# Altium schematic symbol library jlcpcb_2025_04_resistors_extended_2010.schlib: 1697 symbols (part 6 of 9)
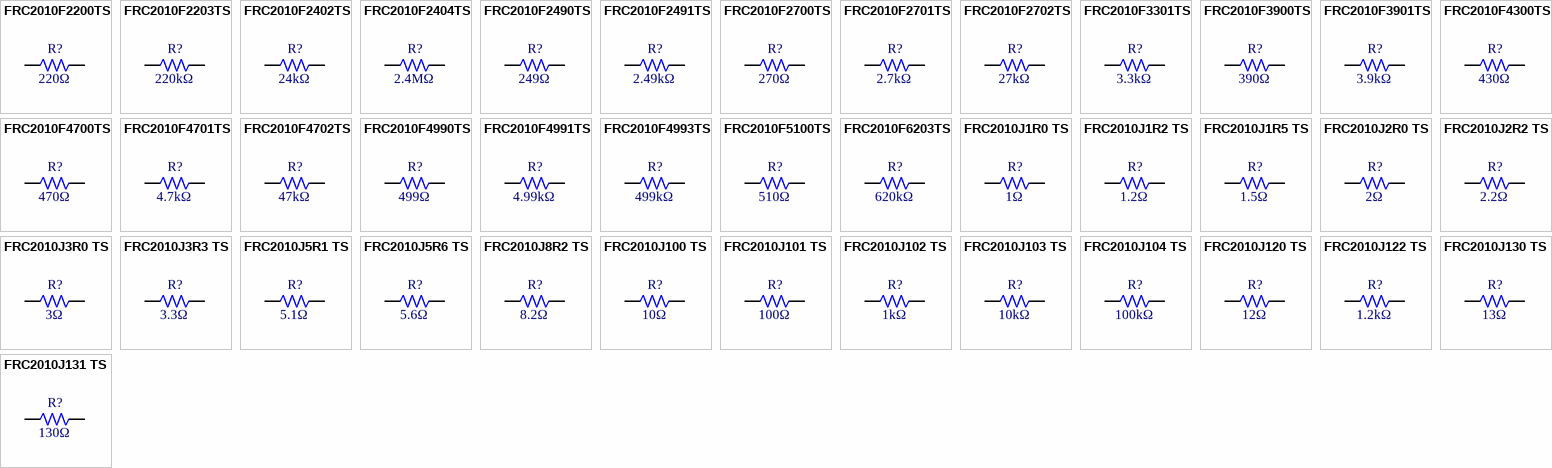
[diagram p47: symbols FRC2010F2200TS to FRC2010J131 TS]

## FRC2010F5100TS
designator R?  Resistance: 510Ω  (hidden comment: *)
Resistor, 510Ω, ±1%, 750mW, 200V, ±100ppm/℃, SMD 2010; Manufacturer: Uniroyal; Manufacturer Part Number: FRC2010F5100TS; Supplier 1: LCSC; Supplier Part Number 1: C3013309; JLCPCB Part Number: C3013309; Power Rating: 750mW; Category: Resistors; Package Size: 2010; JLCPCB Basic Part: Yes; Tolerance: ±1%; Voltage Rating: 200V; Temperature Coefficient: ±100ppm/℃; ComponentLink1Description: Datasheet; ComponentLink1URL: https://wmsc.lcsc.com/wmsc/upload/file/pdf/v2/lcsc/2308241947_FOJAN-FRC2010F5100TS_C3013309.pdf; ComponentLink2Description: JLCPCB Part URL; ComponentLink2URL: https://jlcpcb.com/partdetail/C3013309
pins: 1, 2
1 alternate drawing of the same symbol

## FRC2010F6203TS
designator R?  Resistance: 620kΩ  (hidden comment: *)
Resistor, 620kΩ, ±1%, 750mW, 200V, ±100ppm/℃, -55℃~+155℃, SMD 2010; Manufacturer: Uniroyal; Manufacturer Part Number: FRC2010F6203TS; Supplier 1: LCSC; Supplier Part Number 1: C2930456; JLCPCB Part Number: C2930456; Power Rating: 750mW; Category: Resistors; Package Size: 2010; JLCPCB Basic Part: Yes; Tolerance: ±1%; Voltage Rating: 200V; Temperature Coefficient: ±100ppm/℃; Temperature Rating: -55℃~+155℃; ComponentLink1Description: Datasheet; ComponentLink1URL: https://wmsc.lcsc.com/wmsc/upload/file/pdf/v2/lcsc/2308241947_FOJAN-FRC2010F6203TS_C2930456.pdf; ComponentLink2Description: JLCPCB Part URL; ComponentLink2URL: https://jlcpcb.com/partdetail/C2930456
pins: 1, 2
1 alternate drawing of the same symbol

## FRC2010J1R0 TS
designator R?  Resistance: 1Ω  (hidden comment: *)
Resistor, 1Ω, ±5%, 750mW, 200V, ±200ppm/℃, -55℃~+155℃, SMD 2010; Manufacturer: Uniroyal; Manufacturer Part Number: FRC2010J1R0 TS; Supplier 1: LCSC; Supplier Part Number 1: C2907562; JLCPCB Part Number: C2907562; Power Rating: 750mW; Category: Resistors; Package Size: 2010; JLCPCB Basic Part: Yes; Tolerance: ±5%; Voltage Rating: 200V; Temperature Coefficient: ±200ppm/℃; Temperature Rating: -55℃~+155℃; ComponentLink1Description: Datasheet; ComponentLink1URL: https://wmsc.lcsc.com/wmsc/upload/file/pdf/v2/lcsc/2308241009_FOJAN-FRC2010J1R0-TS_C2907562.pdf; ComponentLink2Description: JLCPCB Part URL; ComponentLink2URL: https://jlcpcb.com/partdetail/C2907562
pins: 1, 2
1 alternate drawing of the same symbol

## FRC2010J1R2 TS
designator R?  Resistance: 1.2Ω  (hidden comment: *)
Resistor, 1.2Ω, ±5%, 750mW, 200V, ±200ppm/℃, -55℃~+155℃, SMD 2010; Manufacturer: Uniroyal; Manufacturer Part Number: FRC2010J1R2 TS; Supplier 1: LCSC; Supplier Part Number 1: C2960840; JLCPCB Part Number: C2960840; Power Rating: 750mW; Category: Resistors; Package Size: 2010; JLCPCB Basic Part: Yes; Tolerance: ±5%; Voltage Rating: 200V; Temperature Coefficient: ±200ppm/℃; Temperature Rating: -55℃~+155℃; ComponentLink1Description: Datasheet; ComponentLink1URL: https://wmsc.lcsc.com/wmsc/upload/file/pdf/v2/lcsc/2308241947_FOJAN-FRC2010J1R2-TS_C2960840.pdf; ComponentLink2Description: JLCPCB Part URL; ComponentLink2URL: https://jlcpcb.com/partdetail/C2960840
pins: 1, 2
1 alternate drawing of the same symbol

## FRC2010J1R5 TS
designator R?  Resistance: 1.5Ω  (hidden comment: *)
Resistor, 1.5Ω, ±5%, 750mW, 200V, ±200ppm/℃, -55℃~+155℃, SMD 2010; Manufacturer: Uniroyal; Manufacturer Part Number: FRC2010J1R5 TS; Supplier 1: LCSC; Supplier Part Number 1: C2934006; JLCPCB Part Number: C2934006; Power Rating: 750mW; Category: Resistors; Package Size: 2010; JLCPCB Basic Part: Yes; Tolerance: ±5%; Voltage Rating: 200V; Temperature Coefficient: ±200ppm/℃; Temperature Rating: -55℃~+155℃; ComponentLink1Description: Datasheet; ComponentLink1URL: https://wmsc.lcsc.com/wmsc/upload/file/pdf/v2/lcsc/2308241947_FOJAN-FRC2010J1R5-TS_C2934006.pdf; ComponentLink2Description: JLCPCB Part URL; ComponentLink2URL: https://jlcpcb.com/partdetail/C2934006
pins: 1, 2
1 alternate drawing of the same symbol

## FRC2010J2R0 TS
designator R?  Resistance: 2Ω  (hidden comment: *)
Resistor, 2Ω, ±5%, 750mW, 200V, ±200ppm/℃, -55℃~+155℃, SMD 2010; Manufacturer: Uniroyal; Manufacturer Part Number: FRC2010J2R0 TS; Supplier 1: LCSC; Supplier Part Number 1: C2960830; JLCPCB Part Number: C2960830; Power Rating: 750mW; Category: Resistors; Package Size: 2010; JLCPCB Basic Part: Yes; Tolerance: ±5%; Voltage Rating: 200V; Temperature Coefficient: ±200ppm/℃; Temperature Rating: -55℃~+155℃; ComponentLink1Description: Datasheet; ComponentLink1URL: https://wmsc.lcsc.com/wmsc/upload/file/pdf/v2/lcsc/2308241947_FOJAN-FRC2010J2R0-TS_C2960830.pdf; ComponentLink2Description: JLCPCB Part URL; ComponentLink2URL: https://jlcpcb.com/partdetail/C2960830
pins: 1, 2
1 alternate drawing of the same symbol

## FRC2010J2R2 TS
designator R?  Resistance: 2.2Ω  (hidden comment: *)
Resistor, 2.2Ω, ±5%, 750mW, 200V, ±200ppm/℃, -55℃~+155℃, SMD 2010; Manufacturer: Uniroyal; Manufacturer Part Number: FRC2010J2R2 TS; Supplier 1: LCSC; Supplier Part Number 1: C2934019; JLCPCB Part Number: C2934019; Power Rating: 750mW; Category: Resistors; Package Size: 2010; JLCPCB Basic Part: Yes; Tolerance: ±5%; Voltage Rating: 200V; Temperature Coefficient: ±200ppm/℃; Temperature Rating: -55℃~+155℃; ComponentLink1Description: Datasheet; ComponentLink1URL: https://wmsc.lcsc.com/wmsc/upload/file/pdf/v2/lcsc/2308241947_FOJAN-FRC2010J2R2-TS_C2934019.pdf; ComponentLink2Description: JLCPCB Part URL; ComponentLink2URL: https://jlcpcb.com/partdetail/C2934019
pins: 1, 2
1 alternate drawing of the same symbol

## FRC2010J3R0 TS
designator R?  Resistance: 3Ω  (hidden comment: *)
Resistor, 3Ω, ±5%, 750mW, 200V, ±200ppm/℃, -55℃~+155℃, SMD 2010; Manufacturer: Uniroyal; Manufacturer Part Number: FRC2010J3R0 TS; Supplier 1: LCSC; Supplier Part Number 1: C2934028; JLCPCB Part Number: C2934028; Power Rating: 750mW; Category: Resistors; Package Size: 2010; JLCPCB Basic Part: Yes; Tolerance: ±5%; Voltage Rating: 200V; Temperature Coefficient: ±200ppm/℃; Temperature Rating: -55℃~+155℃; ComponentLink1Description: Datasheet; ComponentLink1URL: https://wmsc.lcsc.com/wmsc/upload/file/pdf/v2/lcsc/2308241947_FOJAN-FRC2010J3R0-TS_C2934028.pdf; ComponentLink2Description: JLCPCB Part URL; ComponentLink2URL: https://jlcpcb.com/partdetail/C2934028
pins: 1, 2
1 alternate drawing of the same symbol

## FRC2010J3R3 TS
designator R?  Resistance: 3.3Ω  (hidden comment: *)
Resistor, 3.3Ω, ±5%, 750mW, 200V, ±200ppm/℃, -55℃~+155℃, SMD 2010; Manufacturer: Uniroyal; Manufacturer Part Number: FRC2010J3R3 TS; Supplier 1: LCSC; Supplier Part Number 1: C2960892; JLCPCB Part Number: C2960892; Power Rating: 750mW; Category: Resistors; Package Size: 2010; JLCPCB Basic Part: Yes; Tolerance: ±5%; Voltage Rating: 200V; Temperature Coefficient: ±200ppm/℃; Temperature Rating: -55℃~+155℃; ComponentLink1Description: Datasheet; ComponentLink1URL: https://wmsc.lcsc.com/wmsc/upload/file/pdf/v2/lcsc/2308241947_FOJAN-FRC2010J3R3-TS_C2960892.pdf; ComponentLink2Description: JLCPCB Part URL; ComponentLink2URL: https://jlcpcb.com/partdetail/C2960892
pins: 1, 2
1 alternate drawing of the same symbol

## FRC2010J5R1 TS
designator R?  Resistance: 5.1Ω  (hidden comment: *)
Resistor, 5.1Ω, ±5%, 750mW, 200V, ±200ppm/℃, -55℃~+155℃, SMD 2010; Manufacturer: Uniroyal; Manufacturer Part Number: FRC2010J5R1 TS; Supplier 1: LCSC; Supplier Part Number 1: C2934036; JLCPCB Part Number: C2934036; Power Rating: 750mW; Category: Resistors; Package Size: 2010; JLCPCB Basic Part: Yes; Tolerance: ±5%; Voltage Rating: 200V; Temperature Coefficient: ±200ppm/℃; Temperature Rating: -55℃~+155℃; ComponentLink1Description: Datasheet; ComponentLink1URL: https://wmsc.lcsc.com/wmsc/upload/file/pdf/v2/lcsc/2308241947_FOJAN-FRC2010J5R1-TS_C2934036.pdf; ComponentLink2Description: JLCPCB Part URL; ComponentLink2URL: https://jlcpcb.com/partdetail/C2934036
pins: 1, 2
1 alternate drawing of the same symbol

## FRC2010J5R6 TS
designator R?  Resistance: 5.6Ω  (hidden comment: *)
Resistor, 5.6Ω, ±5%, 750mW, 200V, ±200ppm/℃, -55℃~+155℃, SMD 2010; Manufacturer: Uniroyal; Manufacturer Part Number: FRC2010J5R6 TS; Supplier 1: LCSC; Supplier Part Number 1: C2960688; JLCPCB Part Number: C2960688; Power Rating: 750mW; Category: Resistors; Package Size: 2010; JLCPCB Basic Part: Yes; Tolerance: ±5%; Voltage Rating: 200V; Temperature Coefficient: ±200ppm/℃; Temperature Rating: -55℃~+155℃; ComponentLink1Description: Datasheet; ComponentLink1URL: https://wmsc.lcsc.com/wmsc/upload/file/pdf/v2/lcsc/2308241947_FOJAN-FRC2010J5R6-TS_C2960688.pdf; ComponentLink2Description: JLCPCB Part URL; ComponentLink2URL: https://jlcpcb.com/partdetail/C2960688
pins: 1, 2
1 alternate drawing of the same symbol

## FRC2010J8R2 TS
designator R?  Resistance: 8.2Ω  (hidden comment: *)
Resistor, 8.2Ω, ±5%, 750mW, 200V, ±200ppm/℃, SMD 2010; Manufacturer: Uniroyal; Manufacturer Part Number: FRC2010J8R2 TS; Supplier 1: LCSC; Supplier Part Number 1: C3013318; JLCPCB Part Number: C3013318; Power Rating: 750mW; Category: Resistors; Package Size: 2010; JLCPCB Basic Part: Yes; Tolerance: ±5%; Voltage Rating: 200V; Temperature Coefficient: ±200ppm/℃; ComponentLink1Description: Datasheet; ComponentLink1URL: https://wmsc.lcsc.com/wmsc/upload/file/pdf/v2/lcsc/2308241947_FOJAN-FRC2010J8R2-TS_C3013318.pdf; ComponentLink2Description: JLCPCB Part URL; ComponentLink2URL: https://jlcpcb.com/partdetail/C3013318
pins: 1, 2
1 alternate drawing of the same symbol

## FRC2010J100 TS
designator R?  Resistance: 10Ω  (hidden comment: *)
Resistor, 10Ω, ±5%, 750mW, 200V, ±200ppm/℃, -55℃~+155℃, SMD 2010; Manufacturer: Uniroyal; Manufacturer Part Number: FRC2010J100 TS; Supplier 1: LCSC; Supplier Part Number 1: C2974101; JLCPCB Part Number: C2974101; Power Rating: 750mW; Category: Resistors; Package Size: 2010; JLCPCB Basic Part: Yes; Tolerance: ±5%; Voltage Rating: 200V; Temperature Coefficient: ±200ppm/℃; Temperature Rating: -55℃~+155℃; ComponentLink1Description: Datasheet; ComponentLink1URL: https://wmsc.lcsc.com/wmsc/upload/file/pdf/v2/lcsc/2202151130_FOJAN-FRC2010J100-TS_C2974101.pdf; ComponentLink2Description: JLCPCB Part URL; ComponentLink2URL: https://jlcpcb.com/partdetail/C2974101
pins: 1, 2
1 alternate drawing of the same symbol

## FRC2010J101 TS
designator R?  Resistance: 100Ω  (hidden comment: *)
Resistor, 100Ω, ±5%, 750mW, 200V, ±100ppm/℃, -55℃~+155℃, SMD 2010; Manufacturer: Uniroyal; Manufacturer Part Number: FRC2010J101 TS; Supplier 1: LCSC; Supplier Part Number 1: C2907558; JLCPCB Part Number: C2907558; Power Rating: 750mW; Category: Resistors; Package Size: 2010; JLCPCB Basic Part: Yes; Tolerance: ±5%; Voltage Rating: 200V; Temperature Coefficient: ±100ppm/℃; Temperature Rating: -55℃~+155℃; ComponentLink1Description: Datasheet; ComponentLink1URL: https://wmsc.lcsc.com/wmsc/upload/file/pdf/v2/lcsc/2308241947_FOJAN-FRC2010J101-TS_C2907558.pdf; ComponentLink2Description: JLCPCB Part URL; ComponentLink2URL: https://jlcpcb.com/partdetail/C2907558
pins: 1, 2
1 alternate drawing of the same symbol

## FRC2010J102 TS
designator R?  Resistance: 1kΩ  (hidden comment: *)
Resistor, 1kΩ, ±5%, 750mW, 200V, ±100ppm/℃, -55℃~+155℃, SMD 2010; Manufacturer: Uniroyal; Manufacturer Part Number: FRC2010J102 TS; Supplier 1: LCSC; Supplier Part Number 1: C2907561; JLCPCB Part Number: C2907561; Power Rating: 750mW; Category: Resistors; Package Size: 2010; JLCPCB Basic Part: Yes; Tolerance: ±5%; Voltage Rating: 200V; Temperature Coefficient: ±100ppm/℃; Temperature Rating: -55℃~+155℃; ComponentLink1Description: Datasheet; ComponentLink1URL: https://wmsc.lcsc.com/wmsc/upload/file/pdf/v2/lcsc/2308241009_FOJAN-FRC2010J102-TS_C2907561.pdf; ComponentLink2Description: JLCPCB Part URL; ComponentLink2URL: https://jlcpcb.com/partdetail/C2907561
pins: 1, 2
1 alternate drawing of the same symbol

## FRC2010J103 TS
designator R?  Resistance: 10kΩ  (hidden comment: *)
Resistor, 10kΩ, ±5%, 750mW, 200V, ±100ppm/℃, -55℃~+155℃, SMD 2010; Manufacturer: Uniroyal; Manufacturer Part Number: FRC2010J103 TS; Supplier 1: LCSC; Supplier Part Number 1: C2933993; JLCPCB Part Number: C2933993; Power Rating: 750mW; Category: Resistors; Package Size: 2010; JLCPCB Basic Part: Yes; Tolerance: ±5%; Voltage Rating: 200V; Temperature Coefficient: ±100ppm/℃; Temperature Rating: -55℃~+155℃; ComponentLink1Description: Datasheet; ComponentLink1URL: https://wmsc.lcsc.com/wmsc/upload/file/pdf/v2/lcsc/2202151130_FOJAN-FRC2010J103-TS_C2933993.pdf; ComponentLink2Description: JLCPCB Part URL; ComponentLink2URL: https://jlcpcb.com/partdetail/C2933993
pins: 1, 2
1 alternate drawing of the same symbol

## FRC2010J104 TS
designator R?  Resistance: 100kΩ  (hidden comment: *)
Resistor, 100kΩ, ±5%, 750mW, 200V, ±100ppm/℃, -55℃~+155℃, SMD 2010; Manufacturer: Uniroyal; Manufacturer Part Number: FRC2010J104 TS; Supplier 1: LCSC; Supplier Part Number 1: C2907557; JLCPCB Part Number: C2907557; Power Rating: 750mW; Category: Resistors; Package Size: 2010; JLCPCB Basic Part: Yes; Tolerance: ±5%; Voltage Rating: 200V; Temperature Coefficient: ±100ppm/℃; Temperature Rating: -55℃~+155℃; ComponentLink1Description: Datasheet; ComponentLink1URL: https://wmsc.lcsc.com/wmsc/upload/file/pdf/v2/lcsc/2308241947_FOJAN-FRC2010J104-TS_C2907557.pdf; ComponentLink2Description: JLCPCB Part URL; ComponentLink2URL: https://jlcpcb.com/partdetail/C2907557
pins: 1, 2
1 alternate drawing of the same symbol

## FRC2010J120 TS
designator R?  Resistance: 12Ω  (hidden comment: *)
Resistor, 12Ω, ±5%, 750mW, 200V, ±100ppm/℃, -55℃~+155℃, SMD 2010; Manufacturer: Uniroyal; Manufacturer Part Number: FRC2010J120 TS; Supplier 1: LCSC; Supplier Part Number 1: C2974102; JLCPCB Part Number: C2974102; Power Rating: 750mW; Category: Resistors; Package Size: 2010; JLCPCB Basic Part: Yes; Tolerance: ±5%; Voltage Rating: 200V; Temperature Coefficient: ±100ppm/℃; Temperature Rating: -55℃~+155℃; ComponentLink1Description: Datasheet; ComponentLink1URL: https://wmsc.lcsc.com/wmsc/upload/file/pdf/v2/lcsc/2308241947_FOJAN-FRC2010J120-TS_C2974102.pdf; ComponentLink2Description: JLCPCB Part URL; ComponentLink2URL: https://jlcpcb.com/partdetail/C2974102
pins: 1, 2
1 alternate drawing of the same symbol

## FRC2010J122 TS
designator R?  Resistance: 1.2kΩ  (hidden comment: *)
Resistor, 1.2kΩ, ±5%, 750mW, 200V, ±100ppm/℃, SMD 2010; Manufacturer: Uniroyal; Manufacturer Part Number: FRC2010J122 TS; Supplier 1: LCSC; Supplier Part Number 1: C3013314; JLCPCB Part Number: C3013314; Power Rating: 750mW; Category: Resistors; Package Size: 2010; JLCPCB Basic Part: Yes; Tolerance: ±5%; Voltage Rating: 200V; Temperature Coefficient: ±100ppm/℃; ComponentLink1Description: Datasheet; ComponentLink1URL: https://wmsc.lcsc.com/wmsc/upload/file/pdf/v2/lcsc/2308241947_FOJAN-FRC2010J122-TS_C3013314.pdf; ComponentLink2Description: JLCPCB Part URL; ComponentLink2URL: https://jlcpcb.com/partdetail/C3013314
pins: 1, 2
1 alternate drawing of the same symbol

## FRC2010J130 TS
designator R?  Resistance: 13Ω  (hidden comment: *)
Resistor, 13Ω, ±5%, 750mW, 200V, ±100ppm/℃, SMD 2010; Manufacturer: Uniroyal; Manufacturer Part Number: FRC2010J130 TS; Supplier 1: LCSC; Supplier Part Number 1: C3013315; JLCPCB Part Number: C3013315; Power Rating: 750mW; Category: Resistors; Package Size: 2010; JLCPCB Basic Part: Yes; Tolerance: ±5%; Voltage Rating: 200V; Temperature Coefficient: ±100ppm/℃; ComponentLink1Description: Datasheet; ComponentLink1URL: https://wmsc.lcsc.com/wmsc/upload/file/pdf/v2/lcsc/2308241947_FOJAN-FRC2010J130-TS_C3013315.pdf; ComponentLink2Description: JLCPCB Part URL; ComponentLink2URL: https://jlcpcb.com/partdetail/C3013315
pins: 1, 2
1 alternate drawing of the same symbol

## FRC2010J131 TS
designator R?  Resistance: 130Ω  (hidden comment: *)
Resistor, 130Ω, ±5%, 750mW, 200V, ±100ppm/℃, -55℃~+155℃, SMD 2010; Manufacturer: Uniroyal; Manufacturer Part Number: FRC2010J131 TS; Supplier 1: LCSC; Supplier Part Number 1: C2933997; JLCPCB Part Number: C2933997; Power Rating: 750mW; Category: Resistors; Package Size: 2010; JLCPCB Basic Part: Yes; Tolerance: ±5%; Voltage Rating: 200V; Temperature Coefficient: ±100ppm/℃; Temperature Rating: -55℃~+155℃; ComponentLink1Description: Datasheet; ComponentLink1URL: https://wmsc.lcsc.com/wmsc/upload/file/pdf/v2/lcsc/2308241947_FOJAN-FRC2010J131-TS_C2933997.pdf; ComponentLink2Description: JLCPCB Part URL; ComponentLink2URL: https://jlcpcb.com/partdetail/C2933997
pins: 1, 2
1 alternate drawing of the same symbol

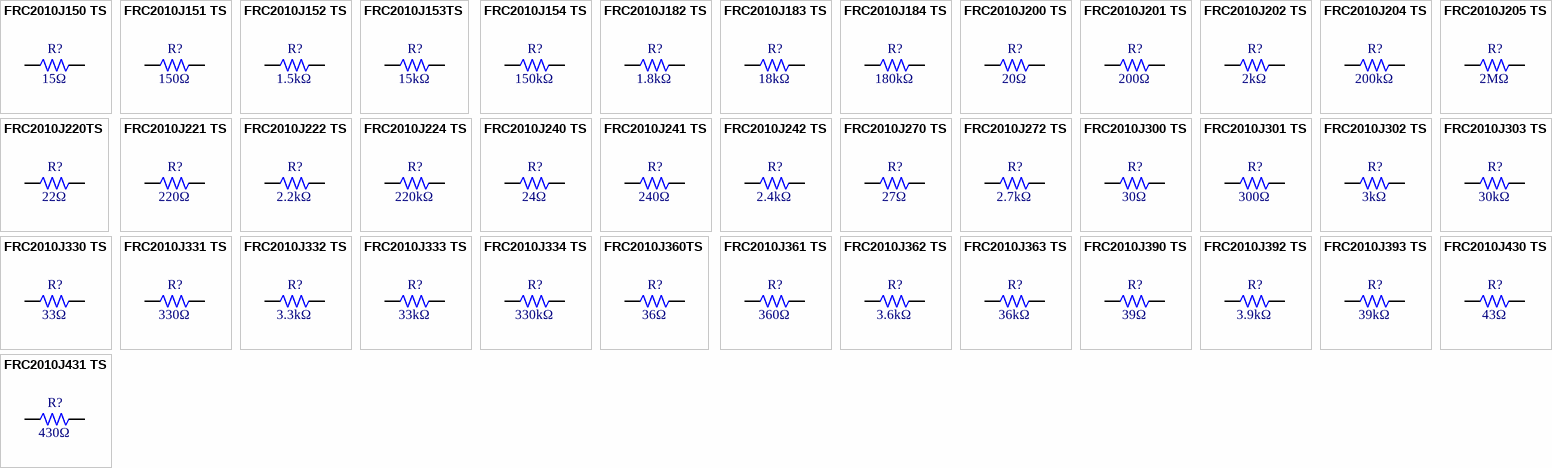
[diagram p25: symbols FRC2010J150 TS to FRC2010J431 TS]

## FRC2010J150 TS
designator R?  Resistance: 15Ω  (hidden comment: *)
Resistor, 15Ω, ±5%, 750mW, 200V, ±100ppm/℃, -55℃~+155℃, SMD 2010; Manufacturer: Uniroyal; Manufacturer Part Number: FRC2010J150 TS; Supplier 1: LCSC; Supplier Part Number 1: C2907559; JLCPCB Part Number: C2907559; Power Rating: 750mW; Category: Resistors; Package Size: 2010; JLCPCB Basic Part: Yes; Tolerance: ±5%; Voltage Rating: 200V; Temperature Coefficient: ±100ppm/℃; Temperature Rating: -55℃~+155℃; ComponentLink1Description: Datasheet; ComponentLink1URL: https://wmsc.lcsc.com/wmsc/upload/file/pdf/v2/lcsc/2308241009_FOJAN-FRC2010J150-TS_C2907559.pdf; ComponentLink2Description: JLCPCB Part URL; ComponentLink2URL: https://jlcpcb.com/partdetail/C2907559
pins: 1, 2
1 alternate drawing of the same symbol

## FRC2010J151 TS
designator R?  Resistance: 150Ω  (hidden comment: *)
Resistor, 150Ω, ±5%, 750mW, 200V, ±100ppm/℃, -55℃~+155℃, SMD 2010; Manufacturer: Uniroyal; Manufacturer Part Number: FRC2010J151 TS; Supplier 1: LCSC; Supplier Part Number 1: C2933998; JLCPCB Part Number: C2933998; Power Rating: 750mW; Category: Resistors; Package Size: 2010; JLCPCB Basic Part: Yes; Tolerance: ±5%; Voltage Rating: 200V; Temperature Coefficient: ±100ppm/℃; Temperature Rating: -55℃~+155℃; ComponentLink1Description: Datasheet; ComponentLink1URL: https://wmsc.lcsc.com/wmsc/upload/file/pdf/v2/lcsc/2308241947_FOJAN-FRC2010J151-TS_C2933998.pdf; ComponentLink2Description: JLCPCB Part URL; ComponentLink2URL: https://jlcpcb.com/partdetail/C2933998
pins: 1, 2
1 alternate drawing of the same symbol

## FRC2010J152 TS
designator R?  Resistance: 1.5kΩ  (hidden comment: *)
Resistor, 1.5kΩ, ±5%, 750mW, 200V, ±100ppm/℃, -55℃~+155℃, SMD 2010; Manufacturer: Uniroyal; Manufacturer Part Number: FRC2010J152 TS; Supplier 1: LCSC; Supplier Part Number 1: C2960919; JLCPCB Part Number: C2960919; Power Rating: 750mW; Category: Resistors; Package Size: 2010; JLCPCB Basic Part: Yes; Tolerance: ±5%; Voltage Rating: 200V; Temperature Coefficient: ±100ppm/℃; Temperature Rating: -55℃~+155℃; ComponentLink1Description: Datasheet; ComponentLink1URL: https://wmsc.lcsc.com/wmsc/upload/file/pdf/v2/lcsc/2308241947_FOJAN-FRC2010J152-TS_C2960919.pdf; ComponentLink2Description: JLCPCB Part URL; ComponentLink2URL: https://jlcpcb.com/partdetail/C2960919
pins: 1, 2
1 alternate drawing of the same symbol

## FRC2010J153TS
designator R?  Resistance: 15kΩ  (hidden comment: *)
Resistor, 15kΩ, ±5%, 750mW, 200V, ±100ppm/℃, -55℃~+155℃, SMD 2010; Manufacturer: Uniroyal; Manufacturer Part Number: FRC2010J153TS; Supplier 1: LCSC; Supplier Part Number 1: C2930453; JLCPCB Part Number: C2930453; Power Rating: 750mW; Category: Resistors; Package Size: 2010; JLCPCB Basic Part: Yes; Tolerance: ±5%; Voltage Rating: 200V; Temperature Coefficient: ±100ppm/℃; Temperature Rating: -55℃~+155℃; ComponentLink1Description: Datasheet; ComponentLink1URL: https://wmsc.lcsc.com/wmsc/upload/file/pdf/v2/lcsc/2308241947_FOJAN-FRC2010J153TS_C2930453.pdf; ComponentLink2Description: JLCPCB Part URL; ComponentLink2URL: https://jlcpcb.com/partdetail/C2930453
pins: 1, 2
1 alternate drawing of the same symbol

## FRC2010J154 TS
designator R?  Resistance: 150kΩ  (hidden comment: *)
Resistor, 150kΩ, ±5%, 750mW, 200V, ±100ppm/℃, -55℃~+155℃, SMD 2010; Manufacturer: Uniroyal; Manufacturer Part Number: FRC2010J154 TS; Supplier 1: LCSC; Supplier Part Number 1: C2933999; JLCPCB Part Number: C2933999; Power Rating: 750mW; Category: Resistors; Package Size: 2010; JLCPCB Basic Part: Yes; Tolerance: ±5%; Voltage Rating: 200V; Temperature Coefficient: ±100ppm/℃; Temperature Rating: -55℃~+155℃; ComponentLink1Description: Datasheet; ComponentLink1URL: https://wmsc.lcsc.com/wmsc/upload/file/pdf/v2/lcsc/2308241947_FOJAN-FRC2010J154-TS_C2933999.pdf; ComponentLink2Description: JLCPCB Part URL; ComponentLink2URL: https://jlcpcb.com/partdetail/C2933999
pins: 1, 2
1 alternate drawing of the same symbol

## FRC2010J182 TS
designator R?  Resistance: 1.8kΩ  (hidden comment: *)
Resistor, 1.8kΩ, ±5%, 750mW, 200V, ±100ppm/℃, -55℃~+155℃, SMD 2010; Manufacturer: Uniroyal; Manufacturer Part Number: FRC2010J182 TS; Supplier 1: LCSC; Supplier Part Number 1: C2934003; JLCPCB Part Number: C2934003; Power Rating: 750mW; Category: Resistors; Package Size: 2010; JLCPCB Basic Part: Yes; Tolerance: ±5%; Voltage Rating: 200V; Temperature Coefficient: ±100ppm/℃; Temperature Rating: -55℃~+155℃; ComponentLink1Description: Datasheet; ComponentLink1URL: https://wmsc.lcsc.com/wmsc/upload/file/pdf/v2/lcsc/2308241947_FOJAN-FRC2010J182-TS_C2934003.pdf; ComponentLink2Description: JLCPCB Part URL; ComponentLink2URL: https://jlcpcb.com/partdetail/C2934003
pins: 1, 2
1 alternate drawing of the same symbol

## FRC2010J183 TS
designator R?  Resistance: 18kΩ  (hidden comment: *)
Resistor, 18kΩ, ±5%, 750mW, 200V, ±100ppm/℃, SMD 2010; Manufacturer: Uniroyal; Manufacturer Part Number: FRC2010J183 TS; Supplier 1: LCSC; Supplier Part Number 1: C3013316; JLCPCB Part Number: C3013316; Power Rating: 750mW; Category: Resistors; Package Size: 2010; JLCPCB Basic Part: Yes; Tolerance: ±5%; Voltage Rating: 200V; Temperature Coefficient: ±100ppm/℃; ComponentLink1Description: Datasheet; ComponentLink1URL: https://wmsc.lcsc.com/wmsc/upload/file/pdf/v2/lcsc/2308241947_FOJAN-FRC2010J183-TS_C3013316.pdf; ComponentLink2Description: JLCPCB Part URL; ComponentLink2URL: https://jlcpcb.com/partdetail/C3013316
pins: 1, 2
1 alternate drawing of the same symbol

## FRC2010J184 TS
designator R?  Resistance: 180kΩ  (hidden comment: *)
Resistor, 180kΩ, ±5%, 750mW, 200V, ±100ppm/℃, -55℃~+155℃, SMD 2010; Manufacturer: Uniroyal; Manufacturer Part Number: FRC2010J184 TS; Supplier 1: LCSC; Supplier Part Number 1: C2934004; JLCPCB Part Number: C2934004; Power Rating: 750mW; Category: Resistors; Package Size: 2010; JLCPCB Basic Part: Yes; Tolerance: ±5%; Voltage Rating: 200V; Temperature Coefficient: ±100ppm/℃; Temperature Rating: -55℃~+155℃; ComponentLink1Description: Datasheet; ComponentLink1URL: https://wmsc.lcsc.com/wmsc/upload/file/pdf/v2/lcsc/2308241947_FOJAN-FRC2010J184-TS_C2934004.pdf; ComponentLink2Description: JLCPCB Part URL; ComponentLink2URL: https://jlcpcb.com/partdetail/C2934004
pins: 1, 2
1 alternate drawing of the same symbol

## FRC2010J200 TS
designator R?  Resistance: 20Ω  (hidden comment: *)
Resistor, 20Ω, ±5%, 750mW, 200V, ±100ppm/℃, -55℃~+155℃, SMD 2010; Manufacturer: Uniroyal; Manufacturer Part Number: FRC2010J200 TS; Supplier 1: LCSC; Supplier Part Number 1: C2934009; JLCPCB Part Number: C2934009; Power Rating: 750mW; Category: Resistors; Package Size: 2010; JLCPCB Basic Part: Yes; Tolerance: ±5%; Voltage Rating: 200V; Temperature Coefficient: ±100ppm/℃; Temperature Rating: -55℃~+155℃; ComponentLink1Description: Datasheet; ComponentLink1URL: https://wmsc.lcsc.com/wmsc/upload/file/pdf/v2/lcsc/2308241947_FOJAN-FRC2010J200-TS_C2934009.pdf; ComponentLink2Description: JLCPCB Part URL; ComponentLink2URL: https://jlcpcb.com/partdetail/C2934009
pins: 1, 2
1 alternate drawing of the same symbol

## FRC2010J201 TS
designator R?  Resistance: 200Ω  (hidden comment: *)
Resistor, 200Ω, ±5%, 750mW, 200V, ±100ppm/℃, -55℃~+155℃, SMD 2010; Manufacturer: Uniroyal; Manufacturer Part Number: FRC2010J201 TS; Supplier 1: LCSC; Supplier Part Number 1: C2960818; JLCPCB Part Number: C2960818; Power Rating: 750mW; Category: Resistors; Package Size: 2010; JLCPCB Basic Part: Yes; Tolerance: ±5%; Voltage Rating: 200V; Temperature Coefficient: ±100ppm/℃; Temperature Rating: -55℃~+155℃; ComponentLink1Description: Datasheet; ComponentLink1URL: https://wmsc.lcsc.com/wmsc/upload/file/pdf/v2/lcsc/2308241947_FOJAN-FRC2010J201-TS_C2960818.pdf; ComponentLink2Description: JLCPCB Part URL; ComponentLink2URL: https://jlcpcb.com/partdetail/C2960818
pins: 1, 2
1 alternate drawing of the same symbol

## FRC2010J202 TS
designator R?  Resistance: 2kΩ  (hidden comment: *)
Resistor, 2kΩ, ±5%, 750mW, 200V, ±100ppm/℃, -55℃~+155℃, SMD 2010; Manufacturer: Uniroyal; Manufacturer Part Number: FRC2010J202 TS; Supplier 1: LCSC; Supplier Part Number 1: C2907563; JLCPCB Part Number: C2907563; Power Rating: 750mW; Category: Resistors; Package Size: 2010; JLCPCB Basic Part: Yes; Tolerance: ±5%; Voltage Rating: 200V; Temperature Coefficient: ±100ppm/℃; Temperature Rating: -55℃~+155℃; ComponentLink1Description: Datasheet; ComponentLink1URL: https://wmsc.lcsc.com/wmsc/upload/file/pdf/v2/lcsc/2308241009_FOJAN-FRC2010J202-TS_C2907563.pdf; ComponentLink2Description: JLCPCB Part URL; ComponentLink2URL: https://jlcpcb.com/partdetail/C2907563
pins: 1, 2
1 alternate drawing of the same symbol

## FRC2010J204 TS
designator R?  Resistance: 200kΩ  (hidden comment: *)
Resistor, 200kΩ, ±5%, 750mW, 200V, ±100ppm/℃, -55℃~+155℃, SMD 2010; Manufacturer: Uniroyal; Manufacturer Part Number: FRC2010J204 TS; Supplier 1: LCSC; Supplier Part Number 1: C2960872; JLCPCB Part Number: C2960872; Power Rating: 750mW; Category: Resistors; Package Size: 2010; JLCPCB Basic Part: Yes; Tolerance: ±5%; Voltage Rating: 200V; Temperature Coefficient: ±100ppm/℃; Temperature Rating: -55℃~+155℃; ComponentLink1Description: Datasheet; ComponentLink1URL: https://wmsc.lcsc.com/wmsc/upload/file/pdf/v2/lcsc/2308241947_FOJAN-FRC2010J204-TS_C2960872.pdf; ComponentLink2Description: JLCPCB Part URL; ComponentLink2URL: https://jlcpcb.com/partdetail/C2960872
pins: 1, 2
1 alternate drawing of the same symbol

## FRC2010J205 TS
designator R?  Resistance: 2MΩ  (hidden comment: *)
Resistor, 2MΩ, ±5%, 750mW, 200V, ±100ppm/℃, -55℃~+155℃, SMD 2010; Manufacturer: Uniroyal; Manufacturer Part Number: FRC2010J205 TS; Supplier 1: LCSC; Supplier Part Number 1: C2934010; JLCPCB Part Number: C2934010; Power Rating: 750mW; Category: Resistors; Package Size: 2010; JLCPCB Basic Part: Yes; Tolerance: ±5%; Voltage Rating: 200V; Temperature Coefficient: ±100ppm/℃; Temperature Rating: -55℃~+155℃; ComponentLink1Description: Datasheet; ComponentLink1URL: https://wmsc.lcsc.com/wmsc/upload/file/pdf/v2/lcsc/2308241947_FOJAN-FRC2010J205-TS_C2934010.pdf; ComponentLink2Description: JLCPCB Part URL; ComponentLink2URL: https://jlcpcb.com/partdetail/C2934010
pins: 1, 2
1 alternate drawing of the same symbol

## FRC2010J220TS
designator R?  Resistance: 22Ω  (hidden comment: *)
Resistor, 22Ω, ±5%, 750mW, 200V, ±100ppm/℃, SMD 2010; Manufacturer: Uniroyal; Manufacturer Part Number: FRC2010J220TS; Supplier 1: LCSC; Supplier Part Number 1: C3000647; JLCPCB Part Number: C3000647; Power Rating: 750mW; Category: Resistors; Package Size: 2010; JLCPCB Basic Part: Yes; Tolerance: ±5%; Voltage Rating: 200V; Temperature Coefficient: ±100ppm/℃; ComponentLink1Description: Datasheet; ComponentLink1URL: https://wmsc.lcsc.com/wmsc/upload/file/pdf/v2/lcsc/2308241947_FOJAN-FRC2010J220TS_C3000647.pdf; ComponentLink2Description: JLCPCB Part URL; ComponentLink2URL: https://jlcpcb.com/partdetail/C3000647
pins: 1, 2
1 alternate drawing of the same symbol

## FRC2010J221 TS
designator R?  Resistance: 220Ω  (hidden comment: *)
Resistor, 220Ω, ±5%, 750mW, 200V, ±100ppm/℃, -55℃~+155℃, SMD 2010; Manufacturer: Uniroyal; Manufacturer Part Number: FRC2010J221 TS; Supplier 1: LCSC; Supplier Part Number 1: C2974104; JLCPCB Part Number: C2974104; Power Rating: 750mW; Category: Resistors; Package Size: 2010; JLCPCB Basic Part: Yes; Tolerance: ±5%; Voltage Rating: 200V; Temperature Coefficient: ±100ppm/℃; Temperature Rating: -55℃~+155℃; ComponentLink1Description: Datasheet; ComponentLink1URL: https://wmsc.lcsc.com/wmsc/upload/file/pdf/v2/lcsc/2202151130_FOJAN-FRC2010J221-TS_C2974104.pdf; ComponentLink2Description: JLCPCB Part URL; ComponentLink2URL: https://jlcpcb.com/partdetail/C2974104
pins: 1, 2
1 alternate drawing of the same symbol

## FRC2010J222 TS
designator R?  Resistance: 2.2kΩ  (hidden comment: *)
Resistor, 2.2kΩ, ±5%, 750mW, 200V, ±100ppm/℃, -55℃~+155℃, SMD 2010; Manufacturer: Uniroyal; Manufacturer Part Number: FRC2010J222 TS; Supplier 1: LCSC; Supplier Part Number 1: C2934011; JLCPCB Part Number: C2934011; Power Rating: 750mW; Category: Resistors; Package Size: 2010; JLCPCB Basic Part: Yes; Tolerance: ±5%; Voltage Rating: 200V; Temperature Coefficient: ±100ppm/℃; Temperature Rating: -55℃~+155℃; ComponentLink1Description: Datasheet; ComponentLink1URL: https://wmsc.lcsc.com/wmsc/upload/file/pdf/v2/lcsc/2308241947_FOJAN-FRC2010J222-TS_C2934011.pdf; ComponentLink2Description: JLCPCB Part URL; ComponentLink2URL: https://jlcpcb.com/partdetail/C2934011
pins: 1, 2
1 alternate drawing of the same symbol

## FRC2010J224 TS
designator R?  Resistance: 220kΩ  (hidden comment: *)
Resistor, 220kΩ, ±5%, 750mW, 200V, ±100ppm/℃, -55℃~+155℃, SMD 2010; Manufacturer: Uniroyal; Manufacturer Part Number: FRC2010J224 TS; Supplier 1: LCSC; Supplier Part Number 1: C2934012; JLCPCB Part Number: C2934012; Power Rating: 750mW; Category: Resistors; Package Size: 2010; JLCPCB Basic Part: Yes; Tolerance: ±5%; Voltage Rating: 200V; Temperature Coefficient: ±100ppm/℃; Temperature Rating: -55℃~+155℃; ComponentLink1Description: Datasheet; ComponentLink1URL: https://wmsc.lcsc.com/wmsc/upload/file/pdf/v2/lcsc/2308241947_FOJAN-FRC2010J224-TS_C2934012.pdf; ComponentLink2Description: JLCPCB Part URL; ComponentLink2URL: https://jlcpcb.com/partdetail/C2934012
pins: 1, 2
1 alternate drawing of the same symbol

## FRC2010J240 TS
designator R?  Resistance: 24Ω  (hidden comment: *)
Resistor, 24Ω, ±5%, 750mW, 200V, ±100ppm/℃, -55℃~+155℃, SMD 2010; Manufacturer: Uniroyal; Manufacturer Part Number: FRC2010J240 TS; Supplier 1: LCSC; Supplier Part Number 1: C2934014; JLCPCB Part Number: C2934014; Power Rating: 750mW; Category: Resistors; Package Size: 2010; JLCPCB Basic Part: Yes; Tolerance: ±5%; Voltage Rating: 200V; Temperature Coefficient: ±100ppm/℃; Temperature Rating: -55℃~+155℃; ComponentLink1Description: Datasheet; ComponentLink1URL: https://wmsc.lcsc.com/wmsc/upload/file/pdf/v2/lcsc/2308241947_FOJAN-FRC2010J240-TS_C2934014.pdf; ComponentLink2Description: JLCPCB Part URL; ComponentLink2URL: https://jlcpcb.com/partdetail/C2934014
pins: 1, 2
1 alternate drawing of the same symbol

## FRC2010J241 TS
designator R?  Resistance: 240Ω  (hidden comment: *)
Resistor, 240Ω, ±5%, 750mW, 200V, ±100ppm/℃, -55℃~+155℃, SMD 2010; Manufacturer: Uniroyal; Manufacturer Part Number: FRC2010J241 TS; Supplier 1: LCSC; Supplier Part Number 1: C2960924; JLCPCB Part Number: C2960924; Power Rating: 750mW; Category: Resistors; Package Size: 2010; JLCPCB Basic Part: Yes; Tolerance: ±5%; Voltage Rating: 200V; Temperature Coefficient: ±100ppm/℃; Temperature Rating: -55℃~+155℃; ComponentLink1Description: Datasheet; ComponentLink1URL: https://wmsc.lcsc.com/wmsc/upload/file/pdf/v2/lcsc/2308241947_FOJAN-FRC2010J241-TS_C2960924.pdf; ComponentLink2Description: JLCPCB Part URL; ComponentLink2URL: https://jlcpcb.com/partdetail/C2960924
pins: 1, 2
1 alternate drawing of the same symbol

## FRC2010J242 TS
designator R?  Resistance: 2.4kΩ  (hidden comment: *)
Resistor, 2.4kΩ, ±5%, 750mW, 200V, ±100ppm/℃, -55℃~+155℃, SMD 2010; Manufacturer: Uniroyal; Manufacturer Part Number: FRC2010J242 TS; Supplier 1: LCSC; Supplier Part Number 1: C2934015; JLCPCB Part Number: C2934015; Power Rating: 750mW; Category: Resistors; Package Size: 2010; JLCPCB Basic Part: Yes; Tolerance: ±5%; Voltage Rating: 200V; Temperature Coefficient: ±100ppm/℃; Temperature Rating: -55℃~+155℃; ComponentLink1Description: Datasheet; ComponentLink1URL: https://wmsc.lcsc.com/wmsc/upload/file/pdf/v2/lcsc/2308241947_FOJAN-FRC2010J242-TS_C2934015.pdf; ComponentLink2Description: JLCPCB Part URL; ComponentLink2URL: https://jlcpcb.com/partdetail/C2934015
pins: 1, 2
1 alternate drawing of the same symbol

## FRC2010J270 TS
designator R?  Resistance: 27Ω  (hidden comment: *)
Resistor, 27Ω, ±5%, 750mW, 200V, ±100ppm/℃, -55℃~+155℃, SMD 2010; Manufacturer: Uniroyal; Manufacturer Part Number: FRC2010J270 TS; Supplier 1: LCSC; Supplier Part Number 1: C2960829; JLCPCB Part Number: C2960829; Power Rating: 750mW; Category: Resistors; Package Size: 2010; JLCPCB Basic Part: Yes; Tolerance: ±5%; Voltage Rating: 200V; Temperature Coefficient: ±100ppm/℃; Temperature Rating: -55℃~+155℃; ComponentLink1Description: Datasheet; ComponentLink1URL: https://wmsc.lcsc.com/wmsc/upload/file/pdf/v2/lcsc/2308241947_FOJAN-FRC2010J270-TS_C2960829.pdf; ComponentLink2Description: JLCPCB Part URL; ComponentLink2URL: https://jlcpcb.com/partdetail/C2960829
pins: 1, 2
1 alternate drawing of the same symbol

## FRC2010J272 TS
designator R?  Resistance: 2.7kΩ  (hidden comment: *)
Resistor, 2.7kΩ, ±5%, 750mW, 200V, ±100ppm/℃, -55℃~+155℃, SMD 2010; Manufacturer: Uniroyal; Manufacturer Part Number: FRC2010J272 TS; Supplier 1: LCSC; Supplier Part Number 1: C2934018; JLCPCB Part Number: C2934018; Power Rating: 750mW; Category: Resistors; Package Size: 2010; JLCPCB Basic Part: Yes; Tolerance: ±5%; Voltage Rating: 200V; Temperature Coefficient: ±100ppm/℃; Temperature Rating: -55℃~+155℃; ComponentLink1Description: Datasheet; ComponentLink1URL: https://wmsc.lcsc.com/wmsc/upload/file/pdf/v2/lcsc/2308241947_FOJAN-FRC2010J272-TS_C2934018.pdf; ComponentLink2Description: JLCPCB Part URL; ComponentLink2URL: https://jlcpcb.com/partdetail/C2934018
pins: 1, 2
1 alternate drawing of the same symbol

## FRC2010J300 TS
designator R?  Resistance: 30Ω  (hidden comment: *)
Resistor, 30Ω, ±5%, 750mW, 200V, ±100ppm/℃, -55℃~+155℃, SMD 2010; Manufacturer: Uniroyal; Manufacturer Part Number: FRC2010J300 TS; Supplier 1: LCSC; Supplier Part Number 1: C2934020; JLCPCB Part Number: C2934020; Power Rating: 750mW; Category: Resistors; Package Size: 2010; JLCPCB Basic Part: Yes; Tolerance: ±5%; Voltage Rating: 200V; Temperature Coefficient: ±100ppm/℃; Temperature Rating: -55℃~+155℃; ComponentLink1Description: Datasheet; ComponentLink1URL: https://wmsc.lcsc.com/wmsc/upload/file/pdf/v2/lcsc/2202151130_FOJAN-FRC2010J300-TS_C2934020.pdf; ComponentLink2Description: JLCPCB Part URL; ComponentLink2URL: https://jlcpcb.com/partdetail/C2934020
pins: 1, 2
1 alternate drawing of the same symbol

## FRC2010J301 TS
designator R?  Resistance: 300Ω  (hidden comment: *)
Resistor, 300Ω, ±5%, 750mW, 200V, ±100ppm/℃, -55℃~+155℃, SMD 2010; Manufacturer: Uniroyal; Manufacturer Part Number: FRC2010J301 TS; Supplier 1: LCSC; Supplier Part Number 1: C2934021; JLCPCB Part Number: C2934021; Power Rating: 750mW; Category: Resistors; Package Size: 2010; JLCPCB Basic Part: Yes; Tolerance: ±5%; Voltage Rating: 200V; Temperature Coefficient: ±100ppm/℃; Temperature Rating: -55℃~+155℃; ComponentLink1Description: Datasheet; ComponentLink1URL: https://wmsc.lcsc.com/wmsc/upload/file/pdf/v2/lcsc/2308241947_FOJAN-FRC2010J301-TS_C2934021.pdf; ComponentLink2Description: JLCPCB Part URL; ComponentLink2URL: https://jlcpcb.com/partdetail/C2934021
pins: 1, 2
1 alternate drawing of the same symbol

## FRC2010J302 TS
designator R?  Resistance: 3kΩ  (hidden comment: *)
Resistor, 3kΩ, ±5%, 750mW, 200V, ±100ppm/℃, -55℃~+155℃, SMD 2010; Manufacturer: Uniroyal; Manufacturer Part Number: FRC2010J302 TS; Supplier 1: LCSC; Supplier Part Number 1: C2960838; JLCPCB Part Number: C2960838; Power Rating: 750mW; Category: Resistors; Package Size: 2010; JLCPCB Basic Part: Yes; Tolerance: ±5%; Voltage Rating: 200V; Temperature Coefficient: ±100ppm/℃; Temperature Rating: -55℃~+155℃; ComponentLink1Description: Datasheet; ComponentLink1URL: https://wmsc.lcsc.com/wmsc/upload/file/pdf/v2/lcsc/2308241947_FOJAN-FRC2010J302-TS_C2960838.pdf; ComponentLink2Description: JLCPCB Part URL; ComponentLink2URL: https://jlcpcb.com/partdetail/C2960838
pins: 1, 2
1 alternate drawing of the same symbol

## FRC2010J303 TS
designator R?  Resistance: 30kΩ  (hidden comment: *)
Resistor, 30kΩ, ±5%, 750mW, 200V, ±100ppm/℃, -55℃~+155℃, SMD 2010; Manufacturer: Uniroyal; Manufacturer Part Number: FRC2010J303 TS; Supplier 1: LCSC; Supplier Part Number 1: C2934022; JLCPCB Part Number: C2934022; Power Rating: 750mW; Category: Resistors; Package Size: 2010; JLCPCB Basic Part: Yes; Tolerance: ±5%; Voltage Rating: 200V; Temperature Coefficient: ±100ppm/℃; Temperature Rating: -55℃~+155℃; ComponentLink1Description: Datasheet; ComponentLink2Description: JLCPCB Part URL; ComponentLink2URL: https://jlcpcb.com/partdetail/C2934022
pins: 1, 2
1 alternate drawing of the same symbol
